# Altium footprint library SWLIB(150721).PcbLib: 348 footprints (part 8 of 22)
Each footprint in its own frame and in the unit in brackets; x right, y up, seen from the top. Pads: shape width x height; smd on the part's side, far side on the other; paste and mask are expansions set on the pad; w line width, h text height; cw(c..) or ccw(c..) is an arc to the next point about the centre after c.
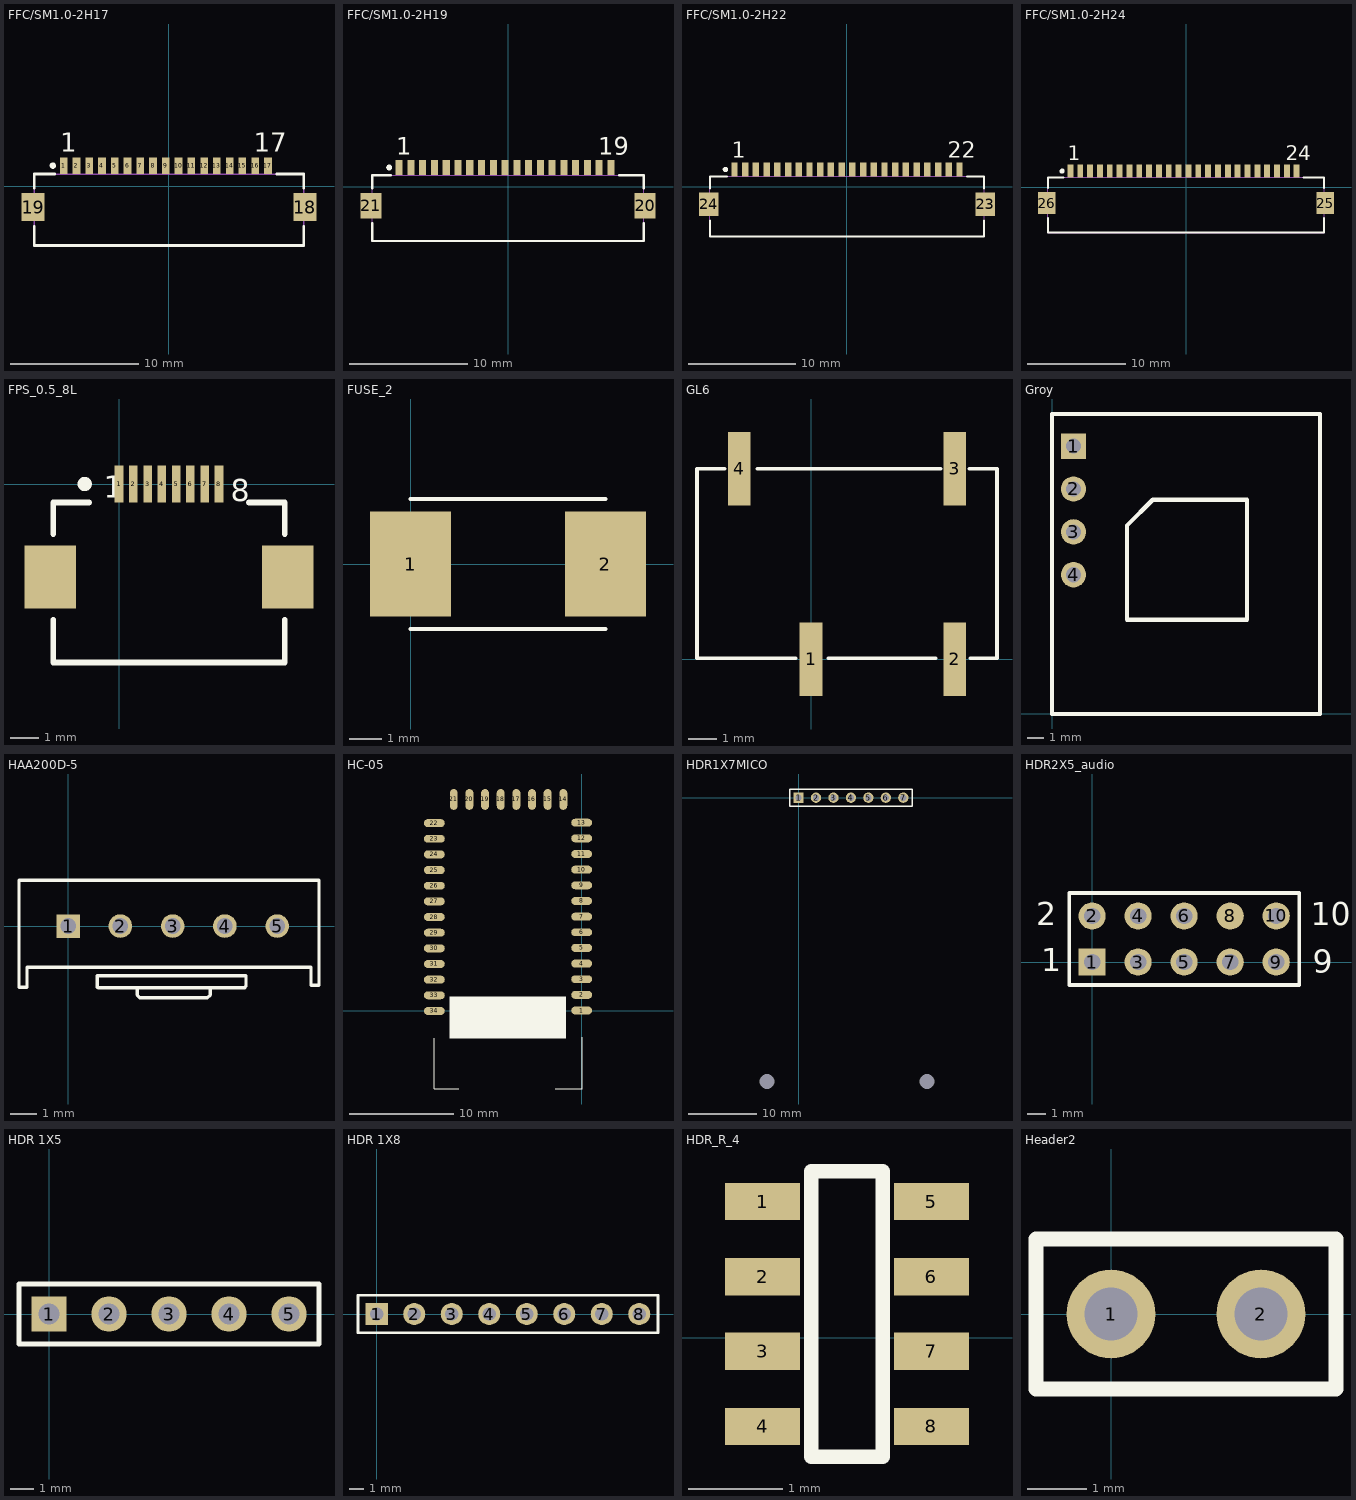
[diagram p7: the footprints below, top view; thin cyan lines are the x and y axes]

## FFC/SM1.0-2H17 [mm] "Connector; FH12 Series; 17 Position; 1.0mm Spaced Bottom Eccentric Contact"
height 2
pads (19):
  rect 0.6x1.3 smd: 1(-8.25,1.625) 2(-7.25,1.625) 3(-6.25,1.625) 4(-5.25,1.625) 5(-4.25,1.625) 6(-3.25,1.625) 7(-2.25,1.625) 8(-1.25,1.625) 9(-0.25,1.625) 10(0.75,1.625) 11(1.75,1.625) 12(2.75,1.625) 13(3.75,1.625) 14(4.75,1.625) 15(5.75,1.625) 16(6.75,1.625) 17(7.75,1.625)
  rect 1.8x2.2 smd: 18(10.65,-1.625) 19(-10.65,-1.625)
Top Overlay:
  circle w0.25: c-9.1,1.625 r0.125
  lines w0.2: -10.55,-3.125 -10.55,-4.625 10.55,-4.625 10.55,-3.125 ; -10.55,-0.125 -10.55,0.975 -8.95,0.975 ; 8.45,0.975 10.55,0.975 10.55,-0.125
  text "1" at -8.5,2.725 h1.5
  text "17" at 6.65,2.725 h1.5
Mechanical 13:
  lines w0.1: -10.55,-4.625 -10.55,0.975 10.55,0.975 10.55,-4.625 -10.55,-4.625
3D body: height 2, standoff 0, extent -10.55,-4.625 10.55,0.975

## FFC/SM1.0-2H19 [mm] "Connector; FH12 Series; 19 Position; 1.0mm Spaced Bottom Eccentric Contact"
height 2
pads (21):
  rect 0.6x1.3 smd: 1(-9.25,1.625) 2(-8.25,1.625) 3(-7.25,1.625) 4(-6.25,1.625) 5(-5.25,1.625) 6(-4.25,1.625) 7(-3.25,1.625) 8(-2.25,1.625) 9(-1.25,1.625) 10(-0.25,1.625) 11(0.75,1.625) 12(1.75,1.625) 13(2.75,1.625) 14(3.75,1.625) 15(4.75,1.625) 16(5.75,1.625) 17(6.75,1.625) 18(7.75,1.625) 19(8.75,1.625)
  rect 1.8x2.2 smd: 20(11.65,-1.625) 21(-11.65,-1.625)
Top Overlay:
  circle w0.25: c-10.1,1.625 r0.125
  lines w0.2: -11.55,-3.125 -11.55,-4.625 11.55,-4.625 11.55,-3.125 ; -11.55,-0.125 -11.55,0.975 -9.95,0.975 ; 9.45,0.975 11.55,0.975 11.55,-0.125
  text "1" at -9.5,2.725 h1.5
  text "19" at 7.65,2.725 h1.5
Mechanical 13:
  lines w0.1: -11.55,-4.625 -11.55,0.975 11.55,0.975 11.55,-4.625 -11.55,-4.625
3D body: height 2, standoff 0, extent -11.55,-4.625 11.55,0.975

## FFC/SM1.0-2H22 [mm] "Connector; FH12 Series; 22 Position; 1.0mm Spaced Bottom Standard Contact"
height 2
pads (24):
  rect 0.6x1.3 smd: 1(-10.5,1.625) 2(-9.5,1.625) 3(-8.5,1.625) 4(-7.5,1.625) 5(-6.5,1.625) 6(-5.5,1.625) 7(-4.5,1.625) 8(-3.5,1.625) 9(-2.5,1.625) 10(-1.5,1.625) 11(-0.5,1.625) 12(0.5,1.625) 13(1.5,1.625) 14(2.5,1.625) 15(3.5,1.625) 16(4.5,1.625) 17(5.5,1.625) 18(6.5,1.625) 19(7.5,1.625) 20(8.5,1.625) 21(9.5,1.625) 22(10.5,1.625)
  rect 1.8x2.2 smd: 23(12.9,-1.625) 24(-12.9,-1.625)
Top Overlay:
  circle w0.25: c-11.35,1.625 r0.125
  lines w0.2: -12.8,-3.125 -12.8,-4.625 12.8,-4.625 12.8,-3.125 ; -12.8,-0.125 -12.8,0.975 -11.2,0.975 ; 11.2,0.975 12.8,0.975 12.8,-0.125
  text "1" at -10.75,2.725 h1.5
  text "22" at 9.4,2.725 h1.5
Mechanical 13:
  lines w0.1: -12.8,-4.625 -12.8,0.975 12.8,0.975 12.8,-4.625 -12.8,-4.625
3D body: height 2, standoff 0, extent -12.8,-4.625 12.8,0.975

## FFC/SM1.0-2H24 [mm] "Connector; FH12 Series; 24 Position; 1.0mm Spaced Bottom Eccentric Contact"
height 2
pads (26):
  rect 0.6x1.3 smd: 1(-11.75,1.625) 2(-10.75,1.625) 3(-9.75,1.625) 4(-8.75,1.625) 5(-7.75,1.625) 6(-6.75,1.625) 7(-5.75,1.625) 8(-4.75,1.625) 9(-3.75,1.625) 10(-2.75,1.625) 11(-1.75,1.625) 12(-0.75,1.625) 13(0.25,1.625) 14(1.25,1.625) 15(2.25,1.625) 16(3.25,1.625) 17(4.25,1.625) 18(5.25,1.625) 19(6.25,1.625) 20(7.25,1.625) 21(8.25,1.625) 22(9.25,1.625) 23(10.25,1.625) 24(11.25,1.625)
  rect 1.8x2.2 smd: 25(14.15,-1.625) 26(-14.15,-1.625)
Top Overlay:
  circle w0.25: c-12.6,1.625 r0.125
  lines w0.2: -14.05,-3.125 -14.05,-4.625 14.05,-4.625 14.05,-3.125 ; -14.05,-0.125 -14.05,0.975 -12.45,0.975 ; 11.95,0.975 14.05,0.975 14.05,-0.125
  text "1" at -12,2.725 h1.5
  text "24" at 10.15,2.725 h1.5
Mechanical 13:
  lines w0.1: -14.05,-4.625 14.05,-4.625 14.05,0.975 -14.05,0.975 -14.05,-4.625
3D body: height 2, standoff 0, extent -14.05,-4.625 14.05,0.975

## FPS_0.5_8L [mm]
pads (10):
  rect 0.3x1.3 smd: 1(0,0) 2(0.5,0) 3(1,0) 4(1.5,0) 5(2,0) 6(2.5,0) 7(3,0) 8(3.5,0)
  rect 1.8x2.2 smd: ""(-2.4,-3.25) ""(5.9,-3.25)
Top Overlay:
  circle w0.25: c-1.2,0 r0.125
  lines w0.2: -2.3,-4.75 -2.3,-6.25 5.8,-6.25 5.8,-4.75 ; -2.3,-1.75 -2.3,-0.65 -1.05,-0.65 ; 4.55,-0.65 5.8,-0.65 5.8,-1.75
  text "1" at -0.536,-0.482 h0.76
  text "8" at 3.909,-0.609 h0.76

## FUSE_2 [mil]
pads (2):
  rect 100x130 smd: 1(0,0) 2(240,0)
Top Overlay:
  lines w5: 0,-80 240,-80 ; 0,80 240,80

## GL6 [mm]
pads (4):
  rect 0.8x2.6 smd: 1(0,0) 2(5.08,0) 3(5.08,6.74) 4(-2.54,6.74)
Top Overlay:
  lines w0.127: -3.048,6.731 -4.03,6.731 -4.03,0.034 -0.542,0.034 ; -1.905,6.731 4.572,6.731 ; 0.601,0.034 4.411,0.034 ; 5.588,6.731 6.57,6.731 6.57,0.034 5.622,0.034

## Groy [mm] "电脑鼠陀螺仪"
pads (4):
  rect 1.5x1.5 hole 0.9: 1(1.27,15.875)
  round 1.5 hole 0.9: 2(1.27,13.335) 3(1.27,10.795) 4(1.27,8.255)
Top Overlay:
  lines w0.254: 0,0 0,17.78 15.875,17.78 15.875,0 0,0 ; 4.445,5.588 11.557,5.588 11.557,12.7 5.969,12.7 4.445,11.176 4.445,5.588

## HAA200D-5 [mm]
pads (5):
  rect 0.9x0.9 hole 0.6: 1(0,0)
  round 0.9 hole 0.6: 2(2,0) 3(4,0) 4(6,0) 5(8,0)
Top Overlay:
  lines w0.127: 2.642,-2.362 2.642,-2.642 2.743,-2.743 5.334,-2.743 5.436,-2.642 5.436,-2.362 ; -1.88,-2.337 -1.575,-2.337 -1.575,-1.575 8.941,-1.575 9.296,-1.575 9.296,-2.261 9.601,-2.261 9.601,1.753 -1.88,1.753 -1.88,-2.337 ; 1.118,-2.337 1.143,-2.362 6.756,-2.362 6.807,-2.311 6.807,-1.905 1.118,-1.905 1.118,-2.337
3D body: height 6, standoff 1, extent -1.702,-2.337 9.423,1.626

## HC-05 [mm]
pads (34):
  oval 2x0.76 smd: 1(0,0) 2(0,1.5) 3(0,3) 4(0,4.5) 5(0,6) 6(0,7.5) 7(0,9) 8(0,10.5) 9(0,12) 10(0,13.5) 11(0,15) 12(0,16.5) 13(0,18) 22(-14.12,17.96) 23(-14.12,16.46) 24(-14.12,14.96) 25(-14.12,13.46) 26(-14.12,11.96) 27(-14.12,10.46) 28(-14.12,8.96) 29(-14.12,7.46) 30(-14.12,5.96) 31(-14.12,4.46) 32(-14.12,2.96) 33(-14.12,1.46) 34(-14.12,-0.04)
  oval 0.76x2 smd: 14(-1.76,20.23) 15(-3.26,20.23) 16(-4.76,20.23) 17(-6.26,20.23) 18(-7.76,20.23) 19(-9.26,20.23) 20(-10.76,20.23) 21(-12.26,20.23)
Top Overlay:
  region: -12.68,1.33 -12.68,-2.67 -1.48,-2.67 -1.48,1.33
  lines w0.1: -14.13,-2.667 -14.13,-7.52 -11.801,-7.52 ; -2.53,-7.52 0.07,-7.52 0.07,-2.54
3D body "HC-05.STEP": height 2.2, standoff 0, extent -13.551,-7.266 -0.551,19.634

## HDR1X7MICO [mm] "Connector; Header; 7 Position"
height 0.508
pads (9):
  round 1 hole 2.159: 0(-4.572,-41.3) 0(18.669,-41.275)
  rect 1.5x1.5 hole 0.9: 1(0,0)
  round 1.5 hole 0.9: 2(2.54,0) 3(5.08,0) 4(7.62,0) 5(10.16,0) 6(12.7,0) 7(15.24,0)
Top Overlay:
  lines w0.2: -1.27,-1.27 -1.27,1.27 16.51,1.27 16.51,-1.27 -1.27,-1.27

## HDR2X5_audio [mm] "Connector; Header; 5x2 Position"
height 2.4
pads (10):
  rect 1.5x1.5 hole 0.9: 1(0,0)
  round 1.5 hole 0.9: 2(0,2.54) 3(2.54,0) 4(2.54,2.54) 5(5.08,0) 6(5.08,2.54) 7(7.62,0) 9(10.16,0) 10(10.16,2.54)
  round 1.5 smd: 8(7.62,2.54)
Top Overlay:
  lines w0.2: -1.27,-1.27 11.43,-1.27 11.43,3.81 -1.27,3.81 -1.27,-1.27
  text "10" at 12.065,2.032 h1.27
  text "9" at 12.192,-0.584 h1.27
  text "1" at -2.819,-0.508 h1.27
  text "2" at -3.099,2.032 h1.27

## HDR 1X5 [mm]
height 5.7
pads (5):
  rect 1.5x1.5 hole 0.9: 1(0,0)
  round 1.5 hole 0.9: 2(2.54,0) 3(5.08,0) 4(7.62,0) 5(10.16,0)
Top Overlay:
  lines w0.2: -1.27,-1.27 -1.27,1.27 11.43,1.27 11.43,-1.27 -1.27,-1.27
3D body: height 10, standoff -2, extent -0.381,-0.381 0.381,0.381
3D body: height 3, standoff 0, extent -1.27,-1.27 1.27,1.27
3D body: height 10, standoff -2, extent 2.159,-0.381 2.921,0.381
3D body: height 3, standoff 0, extent 1.27,-1.27 3.81,1.27
3D body: height 10, standoff -2, extent 4.699,-0.381 5.461,0.381
3D body: height 3, standoff 0, extent 3.81,-1.27 6.35,1.27
3D body: height 10, standoff -2, extent 7.239,-0.381 8.001,0.381
3D body: height 3, standoff 0, extent 6.35,-1.27 8.89,1.27
3D body: height 10, standoff -2, extent 9.779,-0.381 10.541,0.381
3D body: height 3, standoff 0, extent 8.89,-1.27 11.43,1.27

## HDR 1X8 [mm]
height 5.7
pads (8):
  rect 1.5x1.5 hole 0.9: 1(0,0)
  round 1.5 hole 0.9: 2(2.54,0) 3(5.08,0) 4(7.62,0) 5(10.16,0) 6(12.7,0) 7(15.24,0) 8(17.78,0)
Top Overlay:
  lines w0.2: -1.27,-1.27 19.05,-1.27 19.05,1.27 -1.27,1.27 -1.27,-1.27
3D body: height 10, standoff -2, extent -0.381,-0.381 0.381,0.381
3D body: height 3, standoff 0, extent -1.27,-1.27 1.27,1.27
3D body: height 10, standoff -2, extent 2.159,-0.381 2.921,0.381
3D body: height 3, standoff 0, extent 1.27,-1.27 3.81,1.27
3D body: height 10, standoff -2, extent 4.699,-0.381 5.461,0.381
3D body: height 3, standoff 0, extent 3.81,-1.27 6.35,1.27
3D body: height 10, standoff -2, extent 7.239,-0.381 8.001,0.381
3D body: height 3, standoff 0, extent 6.35,-1.27 8.89,1.27
3D body: height 10, standoff -2, extent 9.779,-0.381 10.541,0.381
3D body: height 3, standoff 0, extent 8.89,-1.27 11.43,1.27
3D body: height 10, standoff -2, extent 12.319,-0.381 13.081,0.381
3D body: height 3, standoff 0, extent 11.43,-1.27 13.97,1.27
3D body: height 10, standoff -2, extent 14.859,-0.381 15.621,0.381
3D body: height 3, standoff 0, extent 13.97,-1.27 16.51,1.27
3D body: height 10, standoff -2, extent 17.399,-0.381 18.161,0.381
3D body: height 3, standoff 0, extent 16.51,-1.27 19.05,1.27

## HDR_R_4 [mm]
height 5.7
pads (8):
  rect 0.8x0.4 smd: 1(-4.075,1.454) 2(-4.075,0.654) 3(-4.075,-0.146) 4(-4.075,-0.946) 5(-2.275,1.454) 6(-2.275,0.654) 7(-2.275,-0.146) 8(-2.275,-0.946)
Top Overlay:
  lines w0.152: -3.556,-1.27 -3.556,1.778 -2.794,1.778 -2.794,-1.27 -3.556,-1.27
3D body "User Library-R1206-4R.STEP": height 0.59, standoff 0.01, extent -3.937,-1.346 -2.337,1.854

## Header2 [mm] "2.54mm"
pads (2):
  round 1.5 hole 0.9: 1(0,0) 2(2.54,0)
Top Overlay:
  lines w0.254: -1.27,-1.27 3.81,-1.27 3.81,1.27 -1.27,1.27 -1.27,-1.27